# Altium footprint library Capacitors.PcbLib: 240 footprints (part 1 of 15)
Each footprint in its own frame and in the unit in brackets; x right, y up, seen from the top. Pads: shape width x height; smd on the part's side, far side on the other; paste and mask are expansions set on the pad; w line width, h text height; cw(c..) or ccw(c..) is an arc to the next point about the centre after c.
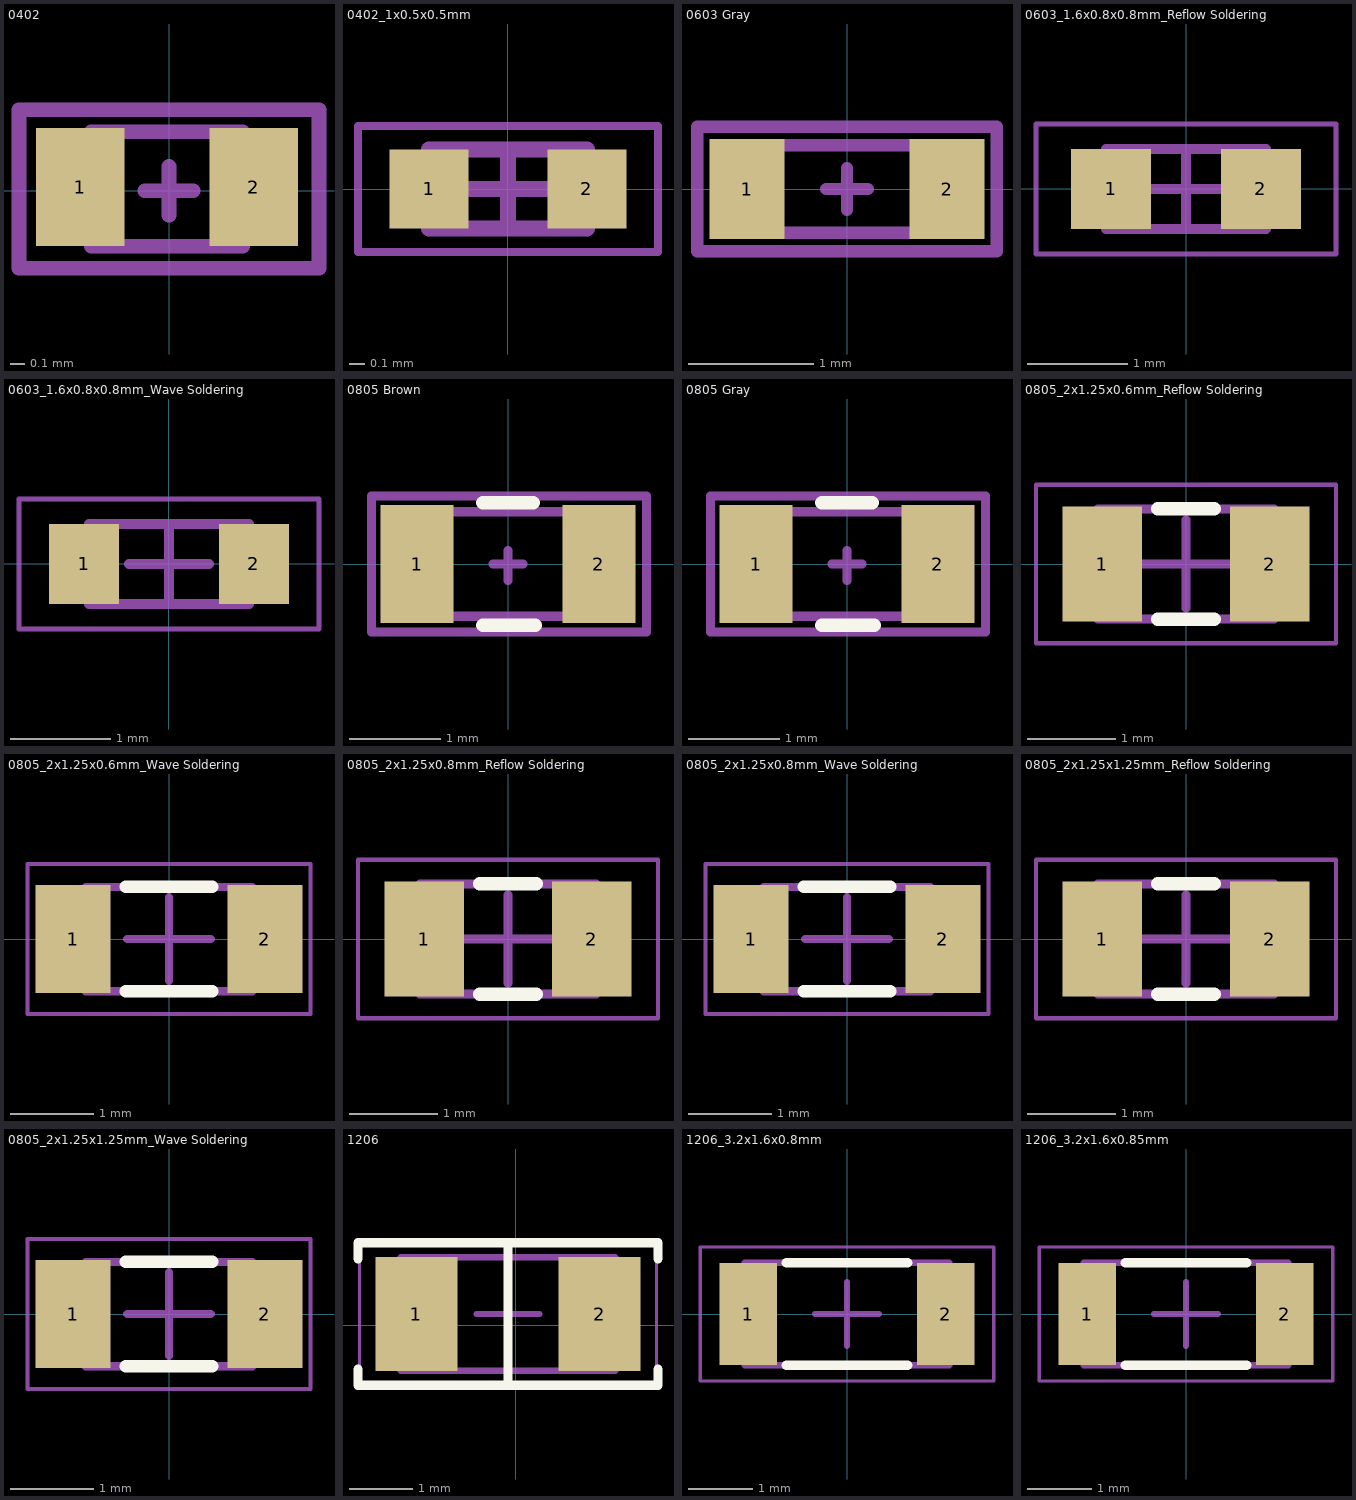
[diagram p0: the footprints below, top view; thin cyan lines are the x and y axes]

## 0402 [mm] "Empaque SMD0403 Azul"
pads (2):
  rect 0.6x0.8 smd: 1(-0.6,0.025) 2(0.575,0.025)
Mechanical 13:
  lines w0.1: -0.525,-0.375 -0.525,0.4 0.5,0.4 0.5,-0.375 -0.525,-0.375
Mechanical 15:
  lines w0.1: -0.165,0 0.165,0 ; 0,-0.165 0,0.165 ; -1.016,-0.525 -1.016,0.55 1.016,0.55 1.016,-0.525 -1.016,-0.525
3D body "0402 SMD Capacitor.STEP": height 0.2, standoff 0, extent -0.5,-0.275 0.5,0.325

## 0402_1x0.5x0.5mm [mm] "Ceramic Capacitors, 0402, body 1x0.5mm"
height 0.5
pads (2):
  rect 0.5x0.5 smd: 1(-0.5,0) 2(0.5,0)
Mechanical 13:
  lines w0.1: -0.5,-0.25 -0.5,0.25 0.5,0.25 0.5,-0.25 -0.5,-0.25
Mechanical 15:
  lines w0.05: -0.95,-0.4 -0.95,0.4 0.95,0.4 0.95,-0.4 -0.95,-0.4
  lines w0.1: -0.25,0 0.25,0 ; 0,-0.25 0,0.25
3D body "1x0.5x0.5x0.25.stp": height 0.53, standoff 0.03, extent -0.5,-0.25 0.5,0.25

## 0603 Gray [mm] "Empaque SMD 0603 Gris"
pads (2):
  rect 0.6x0.8 smd: 1(-0.8,0) 2(0.8,0)
Mechanical 13:
  lines w0.1: -0.8,-0.35 0.8,-0.35 0.8,0.35 -0.8,0.35 -0.8,-0.35
Mechanical 15:
  lines w0.1: -0.165,0 0.165,0 ; 0,-0.165 0,0.165 ; -1.2,-0.5 1.2,-0.5 1.2,0.5 -1.2,0.5 -1.2,-0.5
3D body "CapCeramic_Kemet_0603_1608.STEP": height 0.8, standoff 0, extent -0.8,-0.4 0.8,0.4

## 0603_1.6x0.8x0.8mm_Reflow Soldering [mm] "Ceramic Capacitors, 0603, body 1.6x0.8mm"
height 0.8
pads (2):
  rect 0.8x0.8 smd: 1(-0.75,0) 2(0.75,0)
Mechanical 13:
  lines w0.1: -0.8,-0.4 0.8,-0.4 0.8,0.4 -0.8,0.4 -0.8,-0.4
Mechanical 15:
  lines w0.05: -1.5,-0.65 1.5,-0.65 1.5,0.65 -1.5,0.65 -1.5,-0.65
  lines w0.1: -0.4,0 0.4,0 ; 0,-0.4 0,0.4
3D body "1.6x0.8x0.8x0.4.stp": height 0.83, standoff 0.03, extent -0.8,-0.4 0.8,0.4

## 0603_1.6x0.8x0.8mm_Wave Soldering [mm] "Ceramic Capacitors, 0603, body 1.6x0.8mm"
height 0.8
pads (2):
  rect 0.7x0.8 smd: 1(-0.85,0) 2(0.85,0)
Mechanical 13:
  lines w0.1: -0.8,-0.4 0.8,-0.4 0.8,0.4 -0.8,0.4 -0.8,-0.4
Mechanical 15:
  lines w0.05: -1.5,-0.65 1.5,-0.65 1.5,0.65 -1.5,0.65 -1.5,-0.65
  lines w0.1: -0.4,0 0.4,0 ; 0,-0.4 0,0.4
3D body "1.6x0.8x0.8x0.4.stp": height 0.83, standoff 0.03, extent -0.8,-0.4 0.8,0.4

## 0805 Brown [mm] "Empaque SMD 0805 Gris"
pads (2):
  rect 0.8x1.3 smd: 1(-1,0) 2(1,0)
Top Overlay:
  lines w0.15: -0.275,-0.675 0.3,-0.675 ; -0.275,0.675 0.275,0.675
Mechanical 13:
  lines w0.1: -1,-0.575 -1,0.575 1,0.575 1,-0.575 -1,-0.575
Mechanical 15:
  lines w0.1: -0.165,0 0.165,0 ; 0,-0.18 0,0.15 ; -1.5,-0.75 -1.5,0.75 1.525,0.75 1.525,-0.75 -1.5,-0.75
3D body "0805 SMD Capacitor.step": height 0.78, standoff 0, extent -1.016,-0.635 0.984,0.615

## 0805 Gray [mm] "Empaque SMD 0805 Gris"
pads (2):
  rect 0.8x1.3 smd: 1(-1,0) 2(1,0)
Top Overlay:
  lines w0.15: -0.275,-0.675 0.3,-0.675 ; -0.275,0.675 0.275,0.675
Mechanical 13:
  lines w0.1: -1,-0.575 1,-0.575 1,0.575 -1,0.575 -1,-0.575
Mechanical 15:
  lines w0.1: -0.165,0 0.165,0 ; 0,-0.18 0,0.15 ; -1.5,-0.75 1.525,-0.75 1.525,0.75 -1.5,0.75 -1.5,-0.75
3D body "RESISTOR 0805-DEFAULT.STEP": height 0.43, standoff -0.03, extent -1.025,-0.575 0.975,0.685

## 0805_2x1.25x0.6mm_Reflow Soldering [mm] "Ceramic Capacitors, 0805, body 2x1.25mm"
height 0.6
pads (2):
  rect 0.9x1.3 smd: 1(-0.95,0) 2(0.95,0)
Top Overlay:
  lines w0.15: -0.32,-0.625 0.32,-0.625 ; -0.32,0.625 0.32,0.625
Mechanical 13:
  lines w0.1: -1,-0.625 1,-0.625 1,0.625 -1,0.625 -1,-0.625
Mechanical 15:
  lines w0.05: -1.7,-0.9 1.7,-0.9 1.7,0.9 -1.7,0.9 -1.7,-0.9
  lines w0.1: -0.5,0 0.5,0 ; 0,-0.5 0,0.5
3D body "2x1.25x0.6x0.5.stp": height 0.63, standoff 0.03, extent -1,-0.625 1,0.625

## 0805_2x1.25x0.6mm_Wave Soldering [mm] "Ceramic Capacitors, 0805, body 2x1.25mm"
height 0.6
pads (2):
  rect 0.9x1.3 smd: 1(-1.15,0) 2(1.15,0)
Top Overlay:
  lines w0.15: -0.52,-0.625 0.52,-0.625 ; -0.52,0.625 0.52,0.625
Mechanical 13:
  lines w0.1: -1,-0.625 -1,0.625 1,0.625 1,-0.625 -1,-0.625
Mechanical 15:
  lines w0.05: -1.7,-0.9 -1.7,0.9 1.7,0.9 1.7,-0.9 -1.7,-0.9
  lines w0.1: -0.5,0 0.5,0 ; 0,-0.5 0,0.5
3D body "2x1.25x0.6x0.5.stp": height 0.63, standoff 0.03, extent -1,-0.625 1,0.625

## 0805_2x1.25x0.8mm_Reflow Soldering [mm] "Ceramic Capacitors, 0805, body 2x1.25mm"
height 0.8
pads (2):
  rect 0.9x1.3 smd: 1(-0.95,0) 2(0.95,0)
Top Overlay:
  lines w0.15: -0.32,-0.625 0.32,-0.625 ; -0.32,0.625 0.32,0.625
Mechanical 13:
  lines w0.1: -1,-0.625 -1,0.625 1,0.625 1,-0.625 -1,-0.625
Mechanical 15:
  lines w0.05: -1.7,-0.9 -1.7,0.9 1.7,0.9 1.7,-0.9 -1.7,-0.9
  lines w0.1: -0.5,0 0.5,0 ; 0,-0.5 0,0.5
3D body "2x1.25x0.8x0.5.stp": height 0.83, standoff 0.03, extent -1,-0.625 1,0.625

## 0805_2x1.25x0.8mm_Wave Soldering [mm] "Ceramic Capacitors, 0805, body 2x1.25mm"
height 0.8
pads (2):
  rect 0.9x1.3 smd: 1(-1.15,0) 2(1.15,0)
Top Overlay:
  lines w0.15: -0.52,-0.625 0.52,-0.625 ; -0.52,0.625 0.52,0.625
Mechanical 13:
  lines w0.1: -1,-0.625 1,-0.625 1,0.625 -1,0.625 -1,-0.625
Mechanical 15:
  lines w0.05: -1.7,-0.9 1.7,-0.9 1.7,0.9 -1.7,0.9 -1.7,-0.9
  lines w0.1: -0.5,0 0.5,0 ; 0,-0.5 0,0.5
3D body "2x1.25x0.8x0.5.stp": height 0.83, standoff 0.03, extent -1,-0.625 1,0.625

## 0805_2x1.25x1.25mm_Reflow Soldering [mm] "Ceramic Capacitors, 0805, body 2x1.25mm"
height 1.25
pads (2):
  rect 0.9x1.3 smd: 1(-0.95,0) 2(0.95,0)
Top Overlay:
  lines w0.15: -0.32,-0.625 0.32,-0.625 ; -0.32,0.625 0.32,0.625
Mechanical 13:
  lines w0.1: -1,-0.625 -1,0.625 1,0.625 1,-0.625 -1,-0.625
Mechanical 15:
  lines w0.05: -1.7,-0.9 -1.7,0.9 1.7,0.9 1.7,-0.9 -1.7,-0.9
  lines w0.1: -0.5,0 0.5,0 ; 0,-0.5 0,0.5
3D body "2x1.25x1.25x0.5.stp": height 1.28, standoff 0.03, extent -1,-0.625 1,0.625

## 0805_2x1.25x1.25mm_Wave Soldering [mm] "Ceramic Capacitors, 0805, body 2x1.25mm"
height 1.25
pads (2):
  rect 0.9x1.3 smd: 1(-1.15,0) 2(1.15,0)
Top Overlay:
  lines w0.15: -0.52,-0.625 0.52,-0.625 ; -0.52,0.625 0.52,0.625
Mechanical 13:
  lines w0.1: -1,-0.625 1,-0.625 1,0.625 -1,0.625 -1,-0.625
Mechanical 15:
  lines w0.05: -1.7,-0.9 1.7,-0.9 1.7,0.9 -1.7,0.9 -1.7,-0.9
  lines w0.1: -0.5,0 0.5,0 ; 0,-0.5 0,0.5
3D body "2x1.25x1.25x0.5.stp": height 1.28, standoff 0.03, extent -1,-0.625 1,0.625

## 1206 [mm]
height 0.8
pads (2):
  rect 1.3x1.8 smd: 1(-1.575,0.175) 2(1.325,0.175)
Top Overlay:
  lines w0.15: -2.5,-0.7 -2.5,-0.95 2.25,-0.95 2.25,-0.7 ; -2.5,1.05 -2.5,1.3 2.25,1.3 2.25,1.05 ; -0.125,-0.95 -0.125,1.3
Mechanical 13:
  lines w0.1: -1.825,-0.725 -1.825,1.075 1.575,1.075 1.575,-0.725 -1.825,-0.725
Mechanical 15:
  lines w0.05: -2.475,-0.975 -2.475,1.325 2.225,1.325 2.225,-0.975 -2.475,-0.975
  lines w0.1: -0.625,0.175 0.375,0.175 ; -0.125,-0.325 -0.125,0.675
3D body "C1206.step": height 0.8, standoff 0, extent -1.7,-0.625 1.5,0.975

## 1206_3.2x1.6x0.8mm [mm] "Ceramic Capacitors, 1206, body 3.2x1.6mm"
height 0.8
pads (2):
  rect 0.9x1.6 smd: 1(-1.55,0) 2(1.55,0)
Top Overlay:
  lines w0.15: -0.95,-0.8 0.95,-0.8 ; -0.95,0.8 0.95,0.8
Mechanical 13:
  lines w0.1: -1.6,-0.8 1.6,-0.8 1.6,0.8 -1.6,0.8 -1.6,-0.8
Mechanical 15:
  lines w0.05: -2.3,-1.05 2.3,-1.05 2.3,1.05 -2.3,1.05 -2.3,-1.05
  lines w0.1: -0.5,0 0.5,0 ; 0,-0.5 0,0.5
3D body "3.2x1.6x0.8x0.6.stp": height 0.83, standoff 0.03, extent -1.6,-0.8 1.6,0.8

## 1206_3.2x1.6x0.85mm [mm] "Ceramic Capacitors, 1206, body 3.2x1.6mm"
height 0.85
pads (2):
  rect 0.9x1.6 smd: 1(-1.55,0) 2(1.55,0)
Top Overlay:
  lines w0.15: -0.95,-0.8 0.95,-0.8 ; -0.95,0.8 0.95,0.8
Mechanical 13:
  lines w0.1: -1.6,-0.8 -1.6,0.8 1.6,0.8 1.6,-0.8 -1.6,-0.8
Mechanical 15:
  lines w0.05: -2.3,-1.05 -2.3,1.05 2.3,1.05 2.3,-1.05 -2.3,-1.05
  lines w0.1: -0.5,0 0.5,0 ; 0,-0.5 0,0.5
3D body "3.2x1.6x0.85x0.2.stp": height 0.88, standoff 0.03, extent -1.6,-0.8 1.6,0.8